# Altium footprint library lib_ic_FOOTPRINTS.PcbLib: 98 footprints (part 3 of 7)
Each footprint in its own frame and in the unit in brackets; x right, y up, seen from the top. Pads: shape width x height; smd on the part's side, far side on the other; paste and mask are expansions set on the pad; w line width, h text height; cw(c..) or ccw(c..) is an arc to the next point about the centre after c.
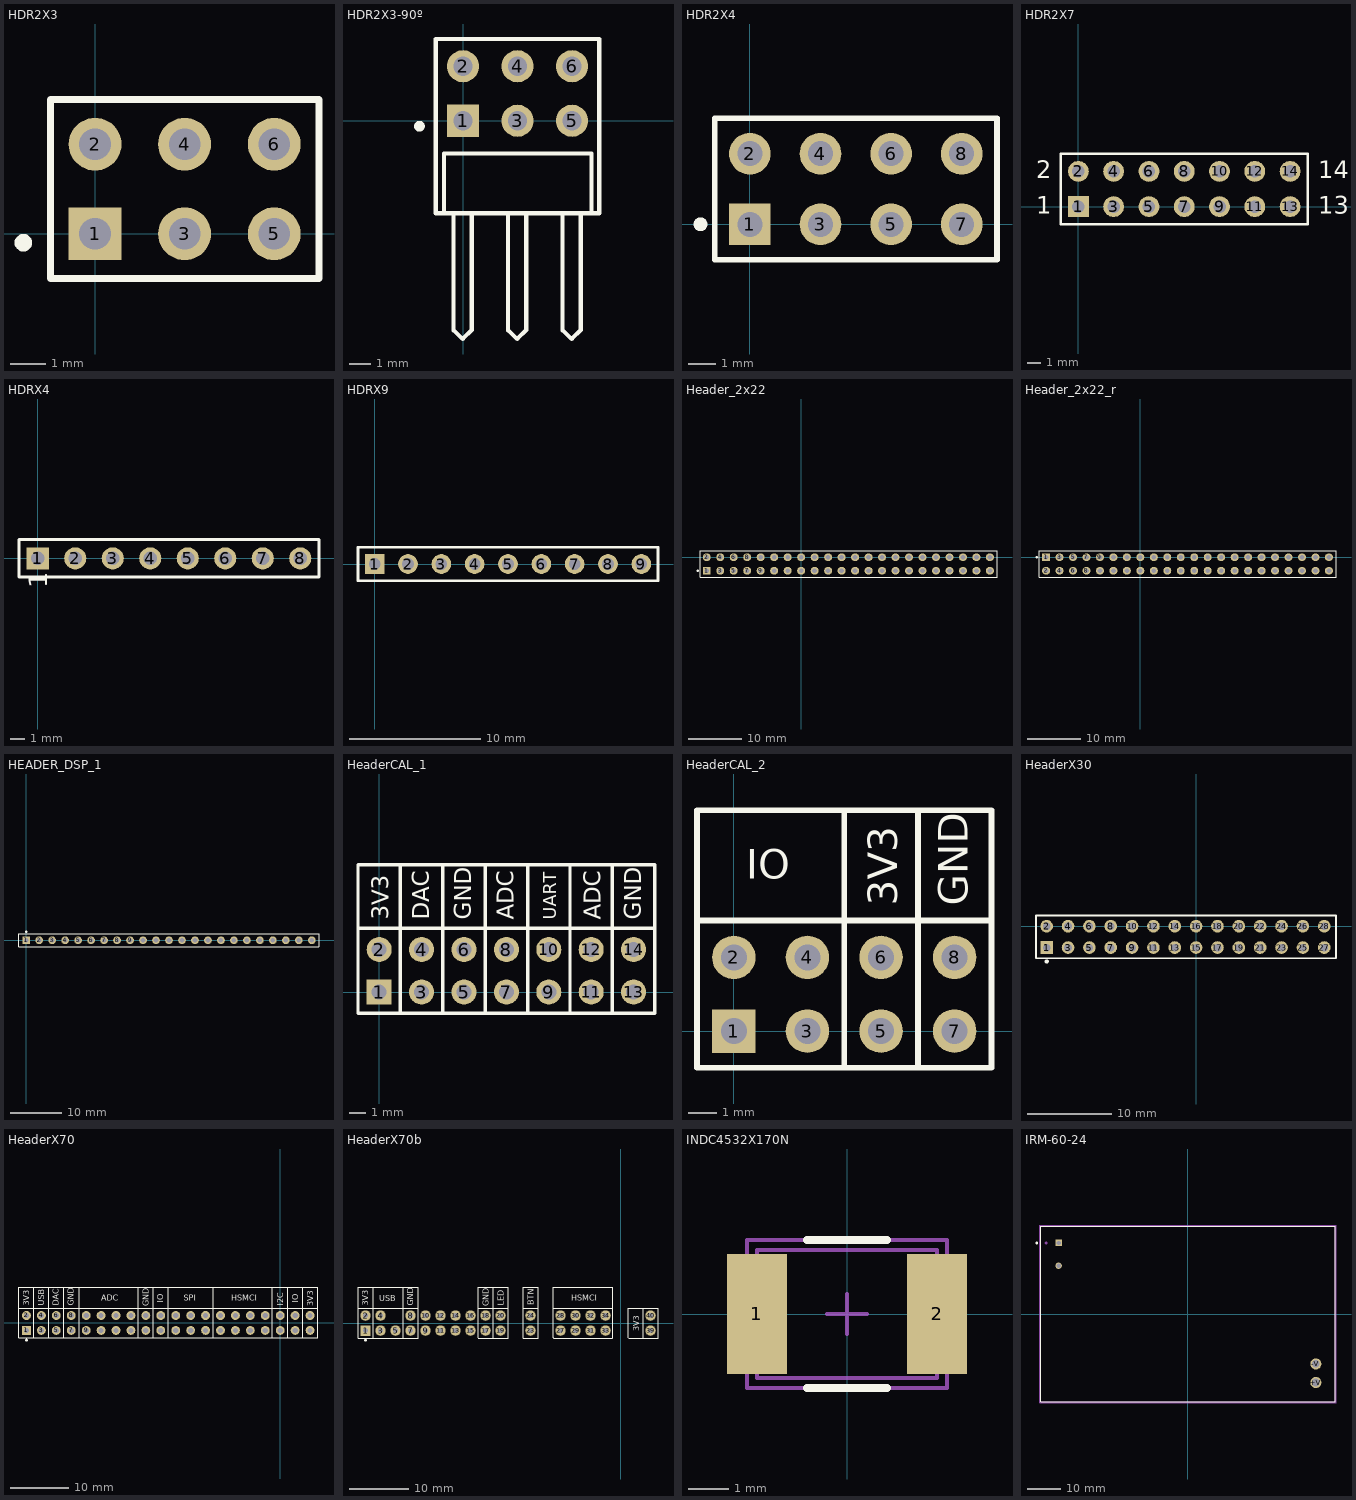
[diagram p2: the footprints below, top view; thin cyan lines are the x and y axes]

## HDR2X3 [mm]
pads (6):
  rect 1.5x1.5 hole 0.9: 1(0,0)
  round 1.5 hole 0.9: 2(0,2.54) 3(2.54,0) 4(2.54,2.54) 5(5.08,0) 6(5.08,2.54)
Top Overlay:
  circle w0.25: c-2.032,-0.254 r0.125
  lines w0.2: -1.27,-1.27 6.35,-1.27 6.35,3.81 -1.27,3.81 -1.27,-1.27
3D body "User Library-2x3 TH Pitch 2_54mm.STEP": height 9.21, standoff -3.49, extent -1.266,-1.27 6.354,3.81

## HDR2X3-90º [mm]
pads (6):
  rect 1.5x1.5 hole 0.9: 1(0,0)
  round 1.5 hole 0.9: 2(0,2.54) 3(2.54,0) 4(2.54,2.54) 5(5.08,0) 6(5.08,2.54)
Top Overlay:
  circle w0.25: c-2.032,-0.254 r0.125
  lines w0.2: -0.887,-4.318 -0.887,-1.524 5.99,-1.524 5.99,-4.318 ; -0.44,-9.777 -0.44,-4.331 ; -0.44,-9.749 -0.017,-10.173 0.406,-9.749 0.406,-4.331 ; 2.1,-9.777 2.1,-4.331 ; 2.1,-9.749 2.523,-10.173 2.946,-9.749 2.946,-4.331 ; 4.64,-9.777 4.64,-4.331 ; 4.64,-9.749 5.063,-10.173 5.486,-9.749 5.486,-4.331 ; -1.27,-4.318 6.35,-4.318 6.35,3.81 -1.27,3.81 -1.27,-4.318
3D body "7731710306lf.stp": height 4.84, standoff -2.39, extent -0.978,-9.788 6.242,2.841

## HDR2X4 [mm]
pads (8):
  rect 1.5x1.5 hole 0.9: 1(0,0)
  round 1.5 hole 0.9: 2(0,2.54) 3(2.54,0) 4(2.54,2.54) 5(5.08,0) 6(5.08,2.54) 7(7.62,0) 8(7.62,2.54)
Top Overlay:
  circle w0.25: c-1.778,0 r0.125
  lines w0.2: 8.826,-1.27 -1.27,-1.27 -1.27,3.81 8.89,3.81 8.89,-1.27
3D body "901310124.stp": height 9.27, standoff -2.88, extent -1.27,-1.27 8.89,3.81

## HDR2X7 [mm]
pads (14):
  rect 1.5x1.5 hole 0.9: 1(0,0)
  round 1.5 hole 0.9: 2(0,2.54) 3(2.54,0) 4(2.54,2.54) 5(5.08,0) 6(5.08,2.54) 7(7.62,0) 8(7.62,2.54) 9(10.16,0) 10(10.16,2.54) 11(12.7,0) 12(12.7,2.54) 13(15.24,0) 14(15.24,2.54)
Top Overlay:
  lines w0.2: -1.27,-1.27 -1.27,3.81 16.51,3.81 16.51,-1.27 -1.27,-1.27
  text "2" at -3.048,2.032 h1.27
  text "1" at -3.048,-0.508 h1.27
  text "14" at 17.272,2.032 h1.27
  text "13" at 17.272,-0.508 h1.27
3D body "901310124.stp": height 9.27, standoff -2.88, extent -1.27,-1.27 8.89,3.81
3D body "901310123.stp": height 9.27, standoff -2.88, extent 8.89,-1.27 16.51,3.81

## HDRX4 [mm]
pads (8):
  rect 1.5x1.5 hole 0.9: 1(0,0)
  round 1.5 hole 0.9: 2(2.54,0) 3(5.08,0) 4(7.62,0) 5(10.16,0) 6(12.7,0) 7(15.24,0) 8(17.78,0)
Top Overlay:
  lines w0.2: -1.27,-1.27 -1.27,1.27 19.05,1.27 19.05,-1.27 -1.27,-1.27
  text "1" at 0.635,-2.032 h1.27

## HDRX9 [mm]
pads (9):
  rect 1.5x1.5 hole 0.9: 1(0,0)
  round 1.5 hole 0.9: 2(2.54,0) 3(5.08,0) 4(7.62,0) 5(10.16,0) 6(12.7,0) 7(15.24,0) 8(17.78,0) 9(20.32,0)
Top Overlay:
  lines w0.2: -1.27,-1.27 21.59,-1.27 21.59,1.27 -1.27,1.27 -1.27,-1.27

## Header_2x22 [mm]
pads (44):
  rect 1.5x1.5 hole 0.9: 1(-17.78,-2.54)
  round 1.5 hole 0.9: 2(-17.78,0) 3(-15.24,-2.54) 4(-15.24,0) 5(-12.7,-2.54) 6(-12.7,0) 7(-10.16,-2.54) 8(-10.16,0) 9(-7.62,-2.54) 10(-7.62,0) 11(-5.08,-2.54) 12(-5.08,0) 13(-2.54,-2.54) 14(-2.54,0) 15(0,-2.54) 16(0,0) 17(2.54,-2.54) 18(2.54,0) 19(5.08,-2.54) 20(5.08,0) 21(7.62,-2.54) 22(7.62,0) 23(10.16,-2.54) 24(10.16,0) 25(12.7,-2.54) 26(12.7,0) 27(15.24,-2.54) 28(15.24,0) 29(17.78,-2.54) 30(17.78,0) 31(20.32,-2.54) 32(20.32,0) 33(22.86,-2.54) 34(22.86,0) 35(25.4,-2.54) 36(25.4,0) 37(27.94,-2.54) 38(27.94,0) 39(30.48,-2.54) 40(30.48,0) 41(33.02,-2.54) 42(33.02,0) 43(35.56,-2.54) 44(35.56,0)
Top Overlay:
  circle w0.25: c-19.493,-2.54 r0.125
  lines w0.2: -19.05,-3.81 36.893,-3.81 36.893,1.27 -19.05,1.27 -19.05,-3.81

## Header_2x22_r [mm]
pads (44):
  rect 1.5x1.5 hole 0.9: 1(-17.78,0)
  round 1.5 hole 0.9: 2(-17.78,-2.54) 3(-15.24,0) 4(-15.24,-2.54) 5(-12.7,0) 6(-12.7,-2.54) 7(-10.16,0) 8(-10.16,-2.54) 9(-7.62,0) 10(-7.62,-2.54) 11(-5.08,0) 12(-5.08,-2.54) 13(-2.54,0) 14(-2.54,-2.54) 15(0,0) 16(0,-2.54) 17(2.54,0) 18(2.54,-2.54) 19(5.08,0) 20(5.08,-2.54) 21(7.62,0) 22(7.62,-2.54) 23(10.16,0) 24(10.16,-2.54) 25(12.7,0) 26(12.7,-2.54) 27(15.24,0) 28(15.24,-2.54) 29(17.78,0) 30(17.78,-2.54) 31(20.32,0) 32(20.32,-2.54) 33(22.86,0) 34(22.86,-2.54) 35(25.4,0) 36(25.4,-2.54) 37(27.94,0) 38(27.94,-2.54) 39(30.48,0) 40(30.48,-2.54) 41(33.02,0) 42(33.02,-2.54) 43(35.56,0) 44(35.56,-2.54)
Top Overlay:
  circle w0.25: c-19.556,0 r0.125
  lines w0.2: -19.05,-3.81 36.893,-3.81 36.893,1.27 -19.05,1.27 -19.05,-3.81

## HEADER_DSP_1 [mm]
pads (23):
  rect 1.5x1.5 hole 0.9: 1(0,0)
  oval 1.51x1.5 hole 0.9: 2(2.54,0) 4(7.62,0) 6(12.7,0) 8(17.78,0) 10(22.86,0) 12(27.94,0) 14(33.02,0) 16(38.1,0) 18(43.18,0) 20(48.26,0) 22(53.34,0) 23(55.88,0)
  round 1.5 hole 0.9: 3(5.08,0) 5(10.16,0) 7(15.24,0) 9(20.32,0) 11(25.4,0) 13(30.48,0) 15(35.56,0) 17(40.64,0) 19(45.72,0) 21(50.8,0)
Top Overlay:
  circle w0.25: c0.002,1.651 r0.125
  lines w0.2: 57.277,-1.27 -1.4,-1.27 -1.4,1.27 57.277,1.27 ; 57.28,-1.27 57.28,1.27

## HeaderCAL_1 [mm]
pads (14):
  rect 1.5x1.5 hole 0.9: 1(0,0)
  round 1.5 hole 0.9: 2(0,2.54) 3(2.54,0) 4(2.54,2.54) 5(5.08,0) 6(5.08,2.54) 7(7.62,0) 8(7.62,2.54) 9(10.16,0) 10(10.16,2.54) 11(12.7,0) 12(12.7,2.54) 13(15.24,0) 14(15.24,2.54)
Top Overlay:
  lines w0.2: -1.27,3.81 16.51,3.81 ; 1.27,-1.27 1.27,7.62 ; 3.81,-1.27 3.81,7.62 ; 6.35,-1.27 6.35,7.62 ; 8.89,-1.27 8.89,7.62 ; 11.43,-1.27 11.43,7.62 ; 13.97,-1.27 13.97,7.62 ; -1.27,-1.27 16.51,-1.27 16.51,7.62 -1.27,7.62 -1.27,-1.27
  text "3V3" at 0.559,4.318 h1.02
  text "DAC" at 2.984,4.318 h1.02
  text "GND" at 5.524,4.318 h1.02
  text "ADC" at 8.064,4.318 h1.02
  text "UART" at 10.604,4.318 h0.76
  text "ADC" at 13.259,4.318 h1.02
  text "GND" at 15.684,4.318 h1.02

## HeaderCAL_2 [mm]
pads (8):
  rect 1.5x1.5 hole 0.9: 1(0,0)
  round 1.5 hole 0.9: 2(0,2.54) 3(2.54,0) 4(2.54,2.54) 5(5.08,0) 6(5.08,2.54) 7(7.62,0) 8(7.62,2.54)
Top Overlay:
  lines w0.2: -1.27,3.81 8.89,3.81 ; 3.81,-1.27 3.81,7.62 ; 6.35,-1.27 6.35,7.62 ; -1.27,-1.27 8.89,-1.27 8.89,7.62 -1.27,7.62 -1.27,-1.27
  text "IO" at 0.432,5.258 h1.02
  text "3V3" at 5.639,4.318 h1.02
  text "GND" at 8.064,4.318 h1.02

## HeaderX30 [mm]
pads (28):
  rect 1.5x1.5 hole 0.9: 1(-17.78,-2.54)
  round 1.5 hole 0.9: 2(-17.78,0) 3(-15.24,-2.54) 4(-15.24,0) 5(-12.7,-2.54) 6(-12.7,0) 7(-10.16,-2.54) 8(-10.16,0) 9(-7.62,-2.54) 10(-7.62,0) 11(-5.08,-2.54) 12(-5.08,0) 13(-2.54,-2.54) 14(-2.54,0) 15(0,-2.54) 16(0,0) 17(2.54,-2.54) 18(2.54,0) 19(5.08,-2.54) 20(5.08,0) 21(7.62,-2.54) 22(7.62,0) 23(10.16,-2.54) 24(10.16,0) 25(12.7,-2.54) 26(12.7,0) 27(15.24,-2.54) 28(15.24,0)
Top Overlay:
  circle w0.25: c-17.778,-4.191 r0.125
  lines w0.2: -19.05,-3.81 16.637,-3.81 16.637,1.27 -19.05,1.27 -19.05,-3.81

## HeaderX70 [mm]
pads (40):
  rect 1.5x1.5 hole 0.9: 1(-43.18,-1.27)
  round 1.5 hole 0.9: 2(-43.18,1.27) 3(-40.64,-1.27) 4(-40.64,1.27) 5(-38.1,-1.27) 6(-38.1,1.27) 7(-35.56,-1.27) 8(-35.56,1.27) 9(-33.02,-1.27) 10(-33.02,1.27) 11(-30.48,-1.27) 12(-30.48,1.27) 13(-27.94,-1.27) 14(-27.94,1.27) 15(-25.4,-1.27) 16(-25.4,1.27) 17(-22.86,-1.27) 18(-22.86,1.27) 19(-20.32,-1.27) 20(-20.32,1.27) 21(-17.78,-1.27) 22(-17.78,1.27) 23(-15.24,-1.27) 24(-15.24,1.27) 25(-12.7,-1.27) 26(-12.7,1.27) 27(-10.16,-1.27) 28(-10.16,1.27) 29(-7.62,-1.27) 30(-7.62,1.27) 31(-5.08,-1.27) 32(-5.08,1.27) 33(-2.54,-1.27) 34(-2.54,1.27) 35(0,-1.27) 36(0,1.27) 37(2.54,-1.27) 38(2.54,1.27) 39(5.08,-1.27) 40(5.08,1.27)
Top Overlay:
  circle w0.25: c-43.178,-2.921 r0.125
  lines w0.2: -41.91,-2.54 -41.91,6.096 ; -39.37,-2.54 -39.37,6.096 ; -36.83,-2.54 -36.83,6.096 ; -34.227,-2.54 -34.227,6.096 ; -24.13,-2.54 -24.13,6.096 ; -21.59,-2.54 -21.59,6.096 ; -19.05,-2.54 -19.05,6.096 ; -11.367,-2.54 -11.367,6.096 ; -1.333,-2.54 -1.333,6.096 ; 1.27,-2.54 1.27,6.096 ; 3.81,-2.54 3.81,6.096 ; 6.35,2.54 -44.45,2.54 ; -44.45,2.54 -44.45,6.096 6.35,6.096 6.35,-2.54 -44.45,-2.54 -44.45,2.54
  text "3V3" at 5.588,2.857 h1.02
  text "IO" at 3.048,3.429 h1.02
  text "I2C" at 0.508,2.921 h1.02
  text "HSMCI" at -8.319,3.81 h1.02
  text "SPI" at -16.447,3.746 h1.02
  text "IO" at -19.939,3.429 h1.02
  text "GND" at -22.352,2.857 h1.02
  text "ADC" at -30.48,3.81 h1.02
  text "GND" at -35.115,2.921 h1.02
  text "DAC" at -37.655,2.921 h1.02
  text "USB" at -40.195,2.921 h1.02
  text "3V3" at -42.735,2.921 h1.02

## HeaderX70b [mil]
pads (31):
  rect 70x70 hole 35: 1(-1700,-50)
  round 70 hole 35: 2(-1700,50) 3(-1600,-50) 4(-1600,50) 5(-1500,-50) 7(-1400,-50) 8(-1400,50) 9(-1300,-50) 10(-1300,50) 11(-1200,-50) 12(-1200,50) 13(-1100,-50) 14(-1100,50) 15(-1000,-50) 16(-1000,50) 17(-900,-50) 18(-900,50) 19(-800,-50) 20(-800,50) 23(-600,-50) 24(-600,50) 27(-400,-50) 28(-400,50) 29(-300,-50) 30(-300,50) 31(-200,-50) 32(-200,50) 33(-100,-50) 34(-100,50) 39(200,-50) 40(200,50)
Top Overlay:
  circle w9.84: c-1699.92,-115 r4.92
  lines w7.87: -1750,-100 -1750,100 ; -1747.5,-100 -1350,-100 ; -1650,-100 -1650,240 ; -1450,-100 -1450,240 ; -1352.5,100 -1750,100 ; -1347.5,-100 -1347.5,240 -1450,240 ; -950,-100 -850,-100 ; -950,-97.5 -950,240 -750,240 -750,-100 -850,-100 ; -947.5,100 -752.5,100 ; -850,240 -850,-100 ; -650,-100 -550,-100 -550,240 -647.5,240 -647.5,-100 ; -647.5,100 -550,100 ; -447.5,100 -52.5,100 ; -447.5,237.5 -447.5,-97.5 -445,-100 -55,-100 ; -445,240 -55,240 -52.5,237.5 -52.5,-100 ; 52.5,-97.5 52.5,100 147.5,100 ; 55,-100 150,-100 ; -1750,100 -1750,240 -1450,240 ; 150,-100 150,100 250,100 250,-100 150,-100
  text "BTN" at -577.5,117.5 h40
  text "3V3" at 125,-55 h40
  text "HSMCI" at -327.5,150 h40
  text "GND" at -880,112.5 h40
  text "LED" at -780,115 h40
  text "GND" at -1382.5,115 h40
  text "USB" at -1610,145 h40
  text "3V3" at -1682.5,115 h40

## INDC4532X170N [mm] "Chip Inductor, Body 4.5x3.2mm, IPC Medium Density"
height 1.7
pads (2):
  rect 1.5x3 smd: 1(-2.25,0) 2(2.25,0)
Top Overlay:
  lines w0.2: -1,-1.85 1,-1.85 ; -1,1.85 1,1.85
Mechanical 13:
  lines w0.1: -2.25,-1.6 -2.25,1.6 2.25,1.6 2.25,-1.6 -2.25,-1.6
Mechanical 15:
  lines w0.1: -0.5,0 0.5,0 ; 0,-0.5 0,0.5 ; -2.5,-1.85 -2.5,1.85 2.5,1.85 2.5,-1.85 -2.5,-1.85
3D body "User Library-Chip Inductor (1).step": height -0.43, standoff -2.18, extent -2.25,-1.6 2.25,1.6

## IRM-60-24 [mm]
pads (4):
  round 3.27 hole 2.254: +V(37.8,-20.25) -V(37.8,-14.75)
  rect 1.881x1.881 hole 1.254: AC/L(-38.2,21)
  round 1.881 hole 1.254: AC/N(-38.2,14.25)
Top Overlay:
  circle w0.4: c-44.69,21 r0.2
  lines w0.127: -43.5,-26 43.5,-26 43.5,26 -43.5,26 -43.5,-26
Mechanical 13:
  circle w0.4: c-41.89,21 r0.2
  lines w0.127: -43.5,-26 43.5,-26 43.5,26 -43.5,26 -43.5,-26
Mechanical 15:
  lines w0.05: -43.75,-26.25 43.75,-26.25 43.75,26.25 -43.75,26.25 -43.75,-26.25
3D body "IRM-60-24.STEP": height 29.51, standoff -3.49, extent -43.5,-26 43.5,26